# Altium footprint library hallglib.PcbLib: 98 footprints (part 4 of 7)
Each footprint in its own frame and in the unit in brackets; x right, y up, seen from the top. Pads: shape width x height; smd on the part's side, far side on the other; paste and mask are expansions set on the pad; w line width, h text height; cw(c..) or ccw(c..) is an arc to the next point about the centre after c.
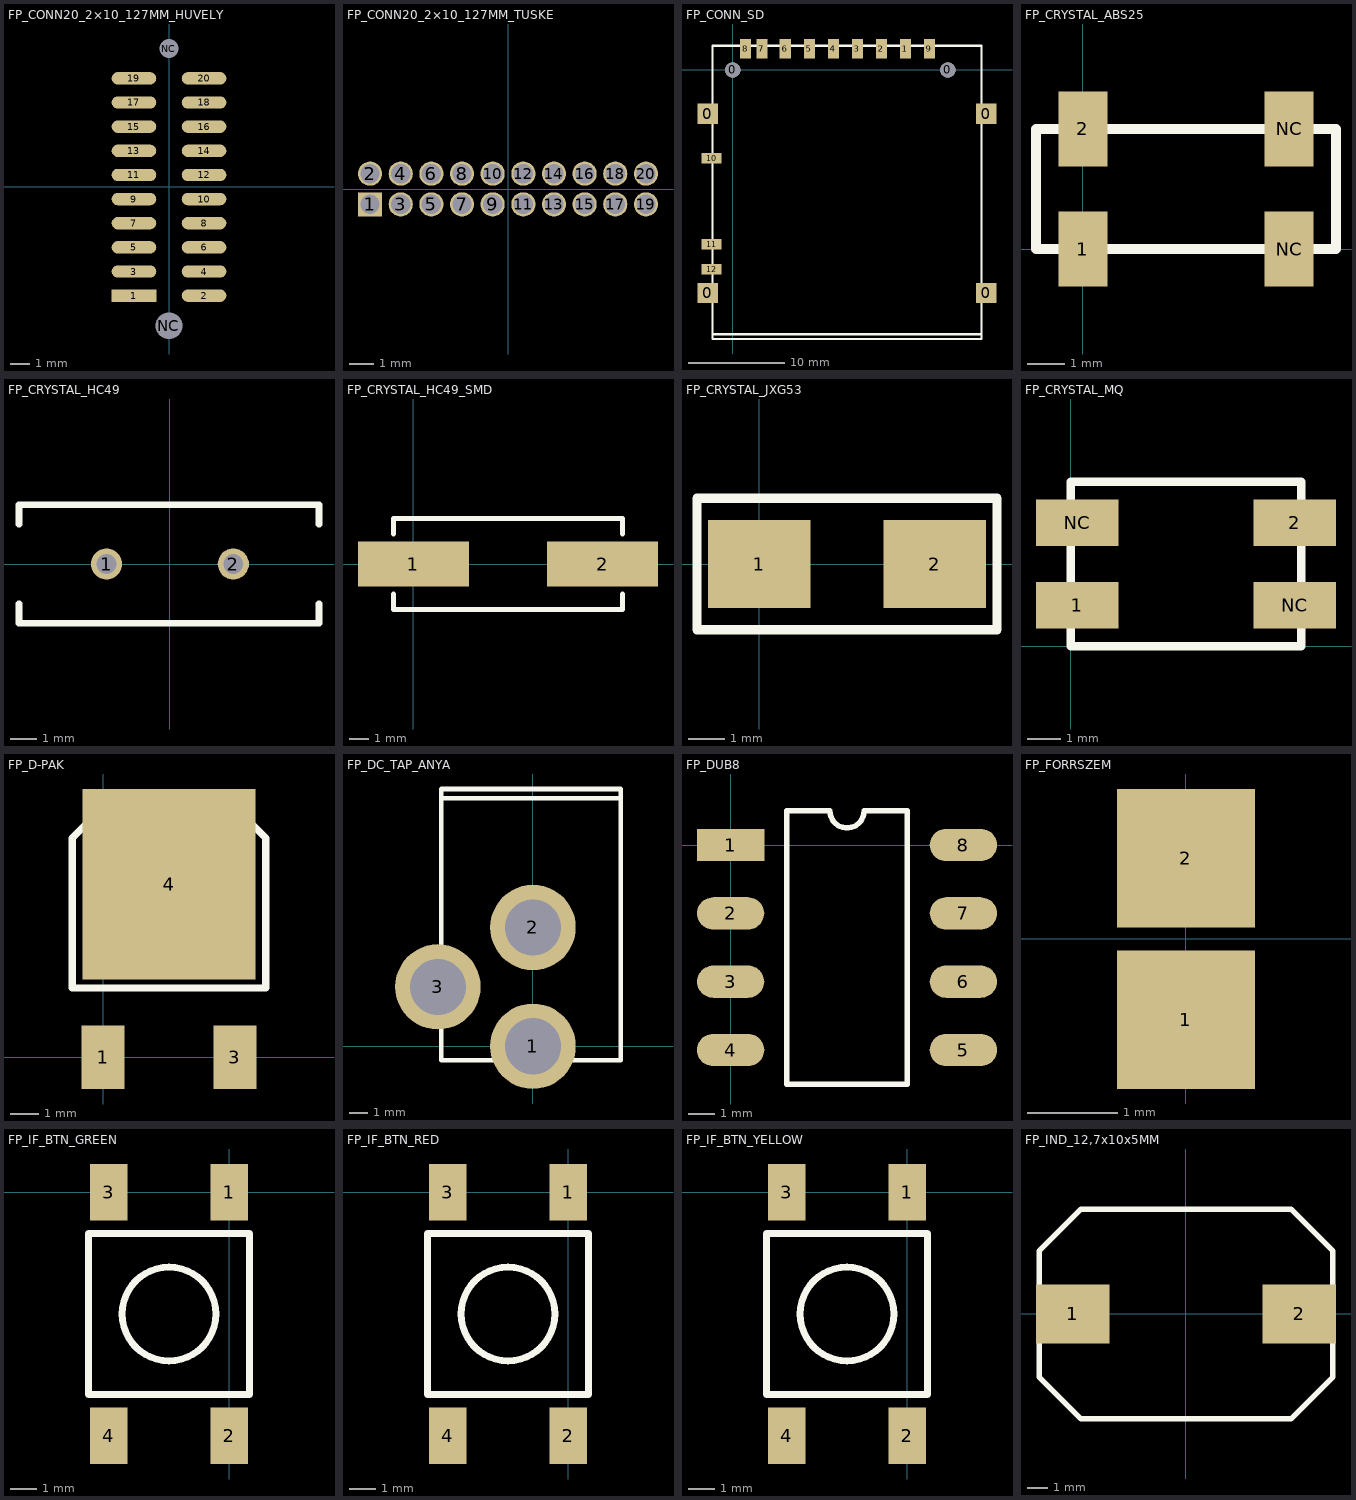
[diagram p3: the footprints below, top view; thin cyan lines are the x and y axes]

## FP_CONN20_2×10_127MM_HUVELY [mm] "2×10 pólusú 1,27mm raszterû hüvelysor"
height 4.85
pads (22):
  rect 2.35x0.65 smd: 1(-1.87,-5.72)
  oval 2.35x0.65 smd: 2(1.82,-5.72) 3(-1.87,-4.45) 4(1.82,-4.45) 5(-1.87,-3.18) 6(1.82,-3.18) 7(-1.87,-1.91) 8(1.82,-1.91) 9(-1.87,-0.64) 10(1.82,-0.64) 11(-1.87,0.63) 12(1.82,0.63) 13(-1.87,1.9) 14(1.82,1.9) 15(-1.87,3.17) 16(1.82,3.17) 17(-1.87,4.44) 18(1.82,4.44) 19(-1.87,5.71) 20(1.82,5.71)
  round 1.3 hole 1.4 unplated: NC(-0.025,-7.3)
  round 0.8 hole 1 unplated: NC(-0.025,7.28)
3D body: height 0.2, standoff 0, extent -2.425,5.505 -0.775,5.905
3D body: height 0.2, standoff 0, extent -2.425,4.235 -0.775,4.635
3D body: height 0.2, standoff 0, extent -2.425,2.965 -0.775,3.365
3D body: height 0.2, standoff 0, extent -2.425,1.695 -0.775,2.095
3D body: height 0.2, standoff 0, extent -2.425,0.425 -0.775,0.825
3D body: height 0.2, standoff 0, extent -2.425,-0.845 -0.775,-0.445
3D body: height 0.2, standoff 0, extent -2.425,-2.115 -0.775,-1.715
3D body: height 0.2, standoff 0, extent -2.425,-3.385 -0.775,-2.985
3D body: height 0.2, standoff 0, extent -2.425,-4.655 -0.775,-4.255
3D body: height 0.2, standoff 0, extent -2.425,-5.925 -0.775,-5.525
3D body: height 0.3, standoff -0.9, extent -0.62,-7.899 0.575,-6.701
3D body: height 0.3, standoff -0.9, extent -0.422,6.881 0.375,7.679
3D body: height 2.45, standoff 0.3, extent -0.675,-8.4 0.625,8.375
3D body: height 4.85, standoff 0.2, extent -1.575,-6.5 1.525,6.5
3D body: height 0.2, standoff 0, extent 0.725,-5.925 2.375,-5.525
3D body: height 0.2, standoff 0, extent 0.725,-4.655 2.375,-4.255
3D body: height 0.2, standoff 0, extent 0.725,-3.385 2.375,-2.985
3D body: height 0.2, standoff 0, extent 0.725,-2.115 2.375,-1.715
3D body: height 0.2, standoff 0, extent 0.725,-0.845 2.375,-0.445
3D body: height 0.2, standoff 0, extent 0.725,0.425 2.375,0.825
3D body: height 0.2, standoff 0, extent 0.725,1.695 2.375,2.095
3D body: height 0.2, standoff 0, extent 0.725,2.965 2.375,3.365
3D body: height 0.2, standoff 0, extent 0.725,4.235 2.375,4.635
3D body: height 0.2, standoff 0, extent 0.725,5.505 2.375,5.905
3D body: height 4.4, standoff 2.1, extent -2.075,-6.5 -1.575,-4.45

## FP_CONN20_2×10_127MM_TUSKE [mm] "2×10 pólusú 1,27mm raszterû tüskesor"
height 5.5
pads (20):
  rect 1x1 hole 0.8 mask+0.102: 1(-5.715,-0.635)
  round 1 hole 0.8: 2(-5.715,0.635) 3(-4.445,-0.635) 4(-4.445,0.635) 5(-3.175,-0.635) 6(-3.175,0.635) 7(-1.905,-0.635) 8(-1.905,0.635) 9(-0.635,-0.635) 10(-0.635,0.635) 11(0.635,-0.635) 12(0.635,0.635) 13(1.905,-0.635) 14(1.905,0.635) 15(3.175,-0.635) 16(3.175,0.635) 17(4.445,-0.635) 18(4.445,0.635) 19(5.715,-0.635) 20(5.715,0.635)
3D body: height 2.5, standoff 0, extent -6.35,-1.7 -5.08,1.7
3D body: height 5.5, standoff -2.35, extent -5.915,-0.835 -5.515,-0.435
3D body: height 5.5, standoff -2.35, extent -5.915,0.435 -5.515,0.835
3D body: height 5.5, standoff -2.35, extent -4.645,0.435 -4.245,0.835
3D body: height 5.5, standoff -2.35, extent -4.645,-0.835 -4.245,-0.435
3D body: height 2.5, standoff 0, extent -5.08,-1.7 -3.81,1.7
3D body: height 5.5, standoff -2.35, extent -3.375,0.435 -2.975,0.835
3D body: height 5.5, standoff -2.35, extent -3.375,-0.835 -2.975,-0.435
3D body: height 2.5, standoff 0, extent -3.81,-1.7 -2.54,1.7
3D body: height 5.5, standoff -2.35, extent -2.105,0.435 -1.705,0.835
3D body: height 5.5, standoff -2.35, extent -2.105,-0.835 -1.705,-0.435
3D body: height 2.5, standoff 0, extent -2.54,-1.7 -1.27,1.7
3D body: height 5.5, standoff -2.35, extent -0.835,0.435 -0.435,0.835
3D body: height 5.5, standoff -2.35, extent -0.835,-0.835 -0.435,-0.435
3D body: height 2.5, standoff 0, extent -1.27,-1.7 0,1.7
3D body: height 5.5, standoff -2.35, extent 0.435,0.435 0.835,0.835
3D body: height 5.5, standoff -2.35, extent 0.435,-0.835 0.835,-0.435
3D body: height 2.5, standoff 0, extent 0,-1.7 1.27,1.7
3D body: height 5.5, standoff -2.35, extent 1.705,0.435 2.105,0.835
3D body: height 5.5, standoff -2.35, extent 1.705,-0.835 2.105,-0.435
3D body: height 2.5, standoff 0, extent 1.27,-1.7 2.54,1.7
3D body: height 5.5, standoff -2.35, extent 2.975,0.435 3.375,0.835
3D body: height 5.5, standoff -2.35, extent 2.975,-0.835 3.375,-0.435
3D body: height 2.5, standoff 0, extent 2.54,-1.7 3.81,1.7
3D body: height 5.5, standoff -2.35, extent 4.245,0.435 4.645,0.835
3D body: height 5.5, standoff -2.35, extent 4.245,-0.835 4.645,-0.435
3D body: height 2.5, standoff 0, extent 3.81,-1.7 5.08,1.7
3D body: height 5.5, standoff -2.35, extent 5.515,0.435 5.915,0.835
3D body: height 5.5, standoff -2.35, extent 5.515,-0.835 5.915,-0.435
3D body: height 2.5, standoff 0, extent 5.08,-1.7 6.35,1.7

## FP_CONN_SD [mm]
height 2.9
pads (18):
  rect 2.1x2.1 smd: 0(-2.6,-23.2) 0(-2.6,-4.55) 0(26.4,-23.2) 0(26.4,-4.55)
  round 1.6 hole 1.6: 0(0,0) 0(22.4,0)
  rect 1.15x2.05 smd: 1(17.975,2.2) 2(15.475,2.2) 3(12.975,2.2) 4(10.475,2.2) 5(7.975,2.2) 6(5.475,2.2) 7(3.05,2.2) 8(1.35,2.2) 9(20.475,2.2)
  rect 2.1x1.1 smd: 10(-2.2,-9.2) 11(-2.2,-18.15) 12(-2.2,-20.75)
Top Overlay:
  lines w0.254: -2.1,-27.5 25.9,-27.5 ; -2.1,-28 25.9,-28 25.9,2.5 -2.1,2.5 -2.1,-28
3D body: height 2.9, standoff 0, extent -2.1,-28 25.9,2.5
3D body: height 2.1, standoff 0.7, extent -0.7,-33 23.3,-28
3D body: height 2.1, standoff 0.7, extent -0.7,-39 23.3,-34
3D body: height 2.1, standoff 0.7, extent -0.7,-34 23.3,-33

## FP_CRYSTAL_ABS25 [mm] "ABRACON - ABS25"
pads (4):
  rect 1.3x2 smd: 1(0,0) 2(0,3.2) NC(5.5,0) NC(5.5,3.2)
Top Overlay:
  lines w0.254: -1.25,0 6.75,0 6.75,3.2 -1.25,3.2 -1.25,0
3D body: height 2.5, standoff 0, extent -1.25,0 6.75,3.2

## FP_CRYSTAL_HC49 [mm] "HC49"
height 3.7
pads (2):
  round 1.2 hole 0.762: 1(-2.44,0) 2(2.44,0)
Top Overlay:
  lines w0.254: -5.816,-1.524 -5.816,-2.286 5.741,-2.286 5.741,-1.524 ; -5.816,1.524 -5.816,2.286 5.741,2.286 5.741,1.524
3D body "SW3dPS-HP49US.STEP": height 3.5, standoff -4, extent -5.675,-2.35 5.675,2.3

## FP_CRYSTAL_HC49_SMD [mil] "HC49/SMD"
height 118.11
pads (2):
  rect 220x90 smd: 1(0,0) 2(375,0)
Top Overlay:
  lines w10: -40,-60 -40,-90 415,-90 415,-60 ; -40,60 -40,90 415,90 415,60
3D body: height 130, standoff 10, extent -25,-80 400,80
3D body: height 10, standoff 0, extent -40,-90 415,90
3D body: height 5, standoff 0, extent -57,-20 -40,20
3D body: height 5, standoff 0, extent 415,-20 432,20

## FP_CRYSTAL_JXG53 [mm] "JXG53 kristály tokozás"
height 1
pads (2):
  rect 2.8x2.4 smd: 1(0,0) 2(4.8,0)
Top Overlay:
  lines w0.254: -1.7,-1.8 -1.7,1.8 6.5,1.8 6.5,-1.8 -1.7,-1.8
3D body: height 1, standoff 0, extent -0.127,-1.524 4.953,1.524

## FP_CRYSTAL_MQ [mm] "EuroQuartz MQ tok"
height 1.2
pads (4):
  rect 2.5x1.4 smd: 1(0.2,1.25) 2(6.8,3.75) NC(0.2,3.75) NC(6.8,1.25)
Top Overlay:
  lines w0.254: 0,0 7,0 7,5 0,5 0,0
3D body "User Library-GeyerElectronics_KX13.STEP": height 1.31, standoff 0, extent 0,0 7,5

## FP_D-PAK [mm] "D-Pak (TO-252-AA)"
height 2.39
pads (3):
  rect 1.5x2.2 smd: 1(0,0) 3(4.572,0)
  rect 6x6.6 smd: 4(2.286,6)
Top Overlay:
  lines w0.254: -1.064,2.404 5.636,2.404 5.636,7.604 4.636,8.604 -0.064,8.604 -1.064,7.604 -1.064,2.404
3D body "D-PAK_TO252AA.STEP": height 2.32, standoff 0.02, extent -0.992,-0.786 5.588,8.914

## FP_DC_TAP_ANYA [mil] "DC HEBA25 TÁPFESZÜLTSÉG ALJZAT ZÁRT, NYÁKBA 90°"
height 421.26
pads (3):
  round 180 hole 118: 1(0,0) 2(0,250) 3(-200,125)
Top Overlay:
  lines w10: -192.91,522.13 185.04,522.13 ; -192.91,-29.53 185.04,-29.53 185.04,541.34 -192.91,541.34 -192.91,-29.53
3D body "kycon kld-0202-a.step": height 440, standoff -141.73, extent -190.39,-30.63 182.52,539.37

## FP_DUB8 [mm] "DUB 8 tokozás (TI ISO1050)"
height 4.85
pads (8):
  rect 2.5x1.2 smd: 1(0,0)
  oval 2.5x1.2 smd: 2(0,-2.54) 3(0,-5.08) 4(0,-7.62) 5(8.65,-7.62) 6(8.65,-5.08) 7(8.65,-2.54) 8(8.65,0)
Top Overlay:
  lines w0.2: 2.085,-8.89 2.085,1.27 3.69,1.27 ccw(c4.325,1.27) 4.96,1.27 6.565,1.27 6.565,-8.89 2.085,-8.89
3D body "8-DUB_body.STEP": height 4.2, standoff 0.9, extent 1,-8.65 7.62,0.85
3D body "8-DUB_legs.STEP": height 2.68, standoff 0, extent -0.9,-7.964 9.6,0.164

## FP_FORRSZEM [mil]
pads (2):
  rect 60x60 smd mask+5: 1(0,-35) 2(0,35)
3D body: height 20, standoff -40, extent -29.68,-29.87 30,29.88

## FP_IF_BTN_GREEN [mm] "OMRON ELECTRONIC COMPONENTS - B3FS-1050 - SWITCH, SPNO, EXTENDED"
height 7.3
pads (4):
  rect 1.4x2.1 smd: 1(0,0) 2(0,-9.1) 3(-4.5,0) 4(-4.5,-9.1)
Top Overlay:
  circle w0.254: c-2.25,-4.55 r1.75
  lines w0.254: -5.25,-7.55 0.75,-7.55 0.75,-1.55 -5.25,-1.55 -5.25,-7.55
3D body: height 2.6, standoff 0, extent -5.4,-7.55 0.95,-1.55
3D body: height 3.1, standoff 2.6, extent -3.55,-5.847 -0.96,-3.253
3D body: height 5.5, standoff 3.1, extent -3.146,-5.446 -1.354,-3.65
3D body: height 7.3, standoff 5.5, extent -3.445,-5.745 -1.055,-3.35
3D body: height 10, standoff 9, extent -4.25,-6.5 -0.25,-2.5
3D body: height 9, standoff 8, extent -4.25,-6.5 -0.25,-2.5
3D body: height 8, standoff 4.5, extent -4.25,-6.5 -0.25,-2.5

## FP_IF_BTN_RED [mm] "OMRON ELECTRONIC COMPONENTS - B3FS-1050 - SWITCH, SPNO, EXTENDED"
height 7.3
pads (4):
  rect 1.4x2.1 smd: 1(0,0) 2(0,-9.1) 3(-4.5,0) 4(-4.5,-9.1)
Top Overlay:
  circle w0.254: c-2.25,-4.55 r1.75
  lines w0.254: -5.25,-7.55 0.75,-7.55 0.75,-1.55 -5.25,-1.55 -5.25,-7.55
3D body: height 2.6, standoff 0, extent -5.4,-7.55 0.95,-1.55
3D body: height 3.1, standoff 2.6, extent -3.55,-5.847 -0.96,-3.253
3D body: height 5.5, standoff 3.1, extent -3.146,-5.446 -1.354,-3.65
3D body: height 7.3, standoff 5.5, extent -3.445,-5.745 -1.055,-3.35
3D body: height 10, standoff 9, extent -4.25,-6.5 -0.25,-2.5
3D body: height 9, standoff 8, extent -4.25,-6.5 -0.25,-2.5
3D body: height 8, standoff 4.5, extent -4.25,-6.5 -0.25,-2.5

## FP_IF_BTN_YELLOW [mm] "OMRON ELECTRONIC COMPONENTS - B3FS-1050 - SWITCH, SPNO, EXTENDED"
height 7.3
pads (4):
  rect 1.4x2.1 smd: 1(0,0) 2(0,-9.1) 3(-4.5,0) 4(-4.5,-9.1)
Top Overlay:
  circle w0.254: c-2.25,-4.55 r1.75
  lines w0.254: -5.25,-7.55 0.75,-7.55 0.75,-1.55 -5.25,-1.55 -5.25,-7.55
3D body: height 2.6, standoff 0, extent -5.4,-7.55 0.95,-1.55
3D body: height 3.1, standoff 2.6, extent -3.55,-5.847 -0.96,-3.253
3D body: height 5.5, standoff 3.1, extent -3.146,-5.446 -1.354,-3.65
3D body: height 7.3, standoff 5.5, extent -3.445,-5.745 -1.055,-3.35
3D body: height 10, standoff 9, extent -4.25,-6.5 -0.25,-2.5
3D body: height 9, standoff 8, extent -4.25,-6.5 -0.25,-2.5
3D body: height 8, standoff 4.5, extent -4.25,-6.5 -0.25,-2.5

## FP_IND_12,7x10x5MM [mm] "Induktivitás"
height 5
pads (2):
  rect 3.5x2.8 smd: 1(-5.4,0) 2(5.4,0)
Top Overlay:
  lines w0.254: -4,-5 -5,-5 -7,-3 -7,-1.6 -7,1.6 -7,3 -5,5 -4,5 ; -4,-5 -4,-5 ; -4,-5 4,-5 ; -4,5 -4,5 ; -4,5 4,5 ; 4,-5 5,-5 7,-3 7,-1.6 7,1.6 7,3 5,5 4,5 ; 4,-5 4,-5 ; 4,5 4,5
3D body: height 5, standoff 4.5, extent -4.216,-4.241 4.25,4.242
3D body: height 1, standoff 0, extent -6.35,-5.08 6.35,5.08
3D body: height 4.5, standoff 1, extent -3.671,-3.693 3.7,3.693